# Altium footprint library hallglib.PcbLib: 106 footprints (part 4 of 7)
Each footprint in its own frame and in the unit in brackets; x right, y up, seen from the top. Pads: shape width x height; smd on the part's side, far side on the other; paste and mask are expansions set on the pad; w line width, h text height; cw(c..) or ccw(c..) is an arc to the next point about the centre after c.
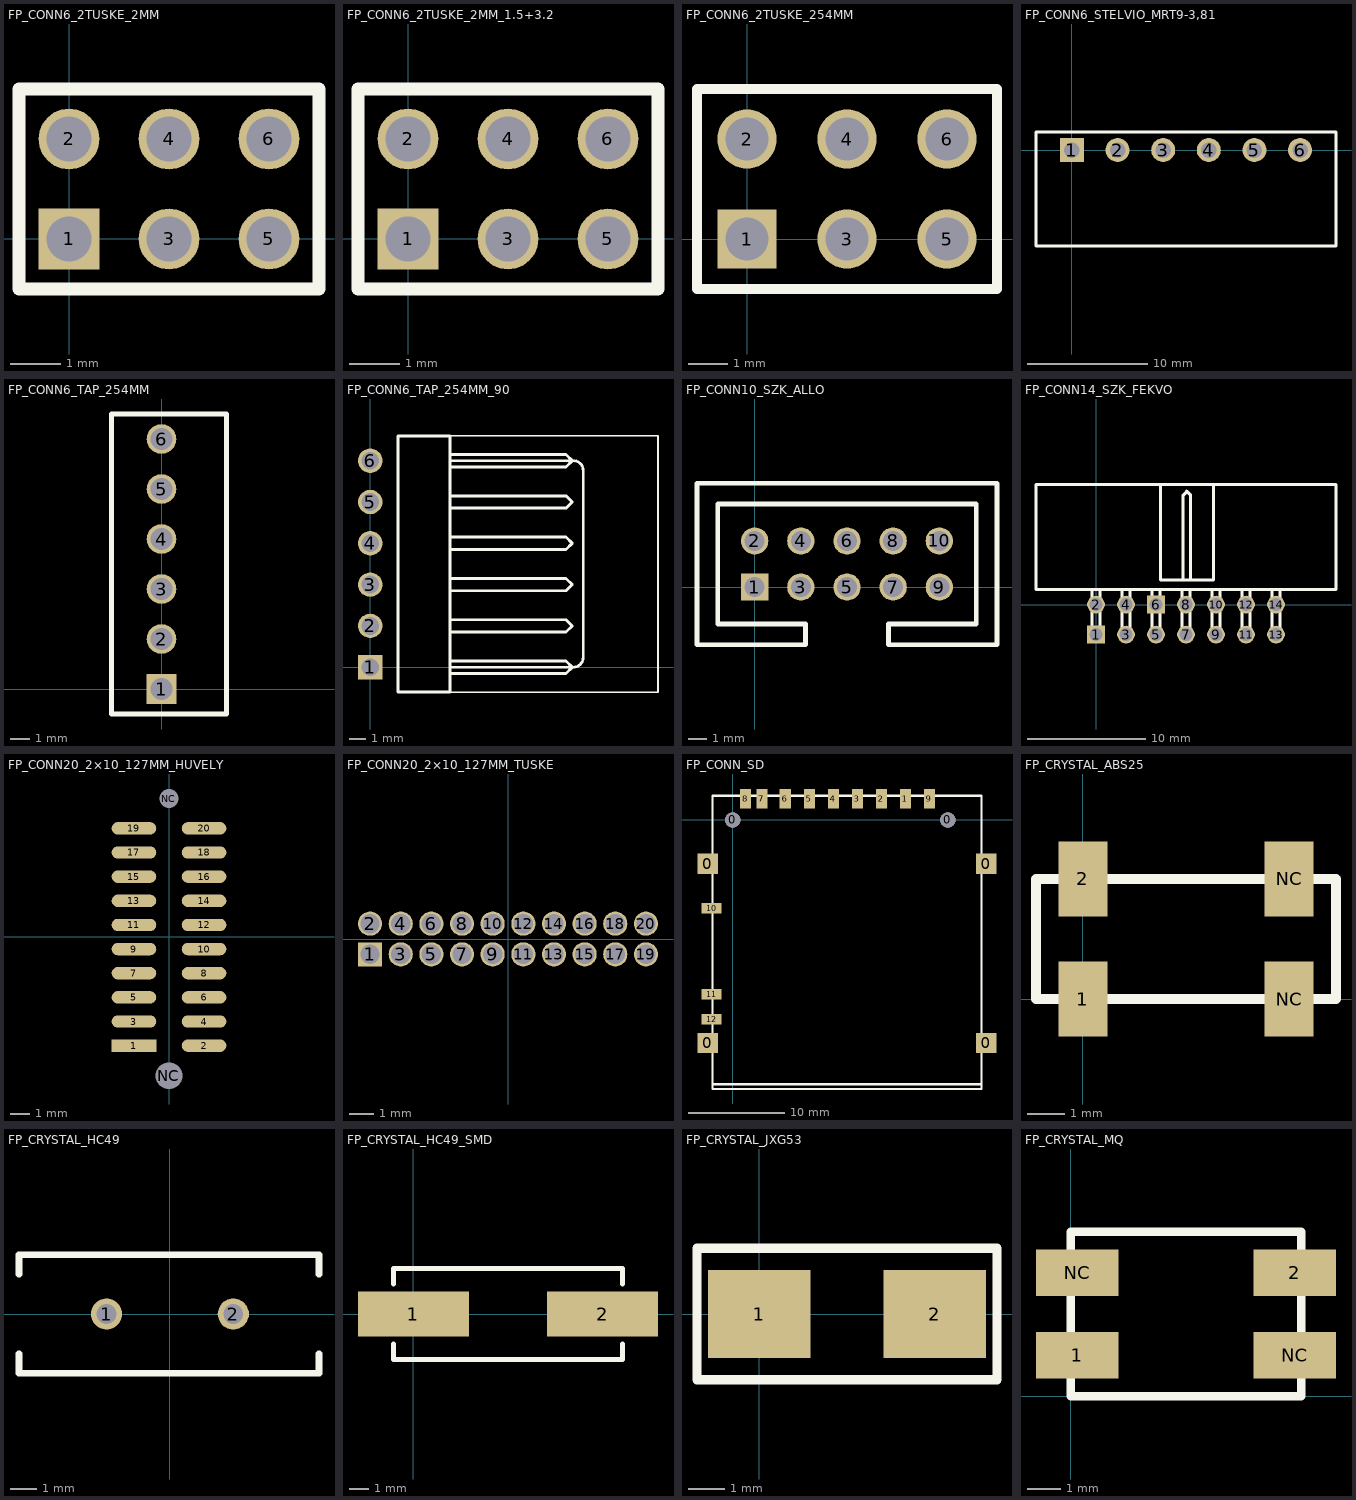
[diagram p3: the footprints below, top view; thin cyan lines are the x and y axes]

## FP_CONN6_2TUSKE_2MM [mm] "2×3-as tüskesor, 2mm-es raszter"
height 5.9
pads (6):
  rect 1.219x1.219 hole 0.9: 1(0,0)
  round 1.219 hole 0.9: 2(0,2) 3(2,0) 4(2,2) 5(4,0) 6(4,2)
Top Overlay:
  lines w0.254: -1,-1 5,-1 5,3 -1,3 -1,-1
3D body: height 5.9, standoff 2, extent -0.254,1.753 0.254,2.261
3D body: height 5.9, standoff 2, extent 1.753,-0.254 2.261,0.254
3D body: height 5.9, standoff 2, extent 1.753,1.753 2.261,2.261
3D body: height 5.9, standoff 2, extent 3.759,-0.254 4.267,0.254
3D body: height 5.9, standoff 2, extent 3.759,1.727 4.267,2.235
3D body: height 5.9, standoff 2, extent -0.254,-0.254 0.254,0.254
3D body: height 2, standoff 0, extent -1.016,-1.016 4.953,2.921
3D body: height 0, standoff -2.8, extent -0.254,-0.254 0.254,0.254
3D body: height 0, standoff -2.8, extent 3.759,1.727 4.267,2.235
3D body: height 0, standoff -2.8, extent 3.759,-0.254 4.267,0.254
3D body: height 0, standoff -2.8, extent 1.753,1.753 2.261,2.261
3D body: height 0, standoff -2.8, extent 1.753,-0.254 2.261,0.254
3D body: height 0, standoff -2.8, extent -0.254,1.753 0.254,2.261

## FP_CONN6_2TUSKE_2MM_1.5+3.2 [mm] "2×3-as tüskesor, 2mm-es raszter, 1.5mm mûanyag + 3.2mm tüske SAMTEC-TMM-1XX-01-..."
height 4.7
pads (6):
  rect 1.219x1.219 hole 0.9: 1(0,0)
  round 1.219 hole 0.9: 2(0,2) 3(2,0) 4(2,2) 5(4,0) 6(4,2)
Top Overlay:
  lines w0.254: -1,-1 -1,3 5,3 5,-1 -1,-1
3D body: height 0, standoff -3, extent -0.254,1.753 0.254,2.261
3D body: height 0, standoff -3, extent 1.753,-0.254 2.261,0.254
3D body: height 0, standoff -3, extent 1.753,1.753 2.261,2.261
3D body: height 0, standoff -3, extent 3.759,-0.254 4.267,0.254
3D body: height 0, standoff -3, extent 3.759,1.727 4.267,2.235
3D body: height 0, standoff -3, extent -0.254,-0.254 0.254,0.254
3D body: height 1.5, standoff 0, extent -1.016,-1.016 4.953,2.921
3D body: height 4.7, standoff 1.5, extent -0.254,-0.254 0.254,0.254
3D body: height 4.7, standoff 1.5, extent 3.759,1.727 4.267,2.235
3D body: height 4.7, standoff 1.5, extent 3.759,-0.254 4.267,0.254
3D body: height 4.7, standoff 1.5, extent 1.753,1.753 2.261,2.261
3D body: height 4.7, standoff 1.5, extent 1.753,-0.254 2.261,0.254
3D body: height 4.7, standoff 1.5, extent -0.254,1.753 0.254,2.261

## FP_CONN6_2TUSKE_254MM [mm] "2×3 tüskesor"
height 8.54
pads (6):
  rect 1.5x1.5 hole 1.1: 1(0,0)
  round 1.5 hole 1.1: 2(0,2.54) 3(2.54,0) 4(2.54,2.54) 5(5.08,0) 6(5.08,2.54)
Top Overlay:
  lines w0.254: -1.27,-1.27 6.35,-1.27 6.35,3.81 -1.27,3.81 -1.27,-1.27
3D body: height 8.54, standoff 2.54, extent -0.33,-0.33 0.33,0.33
3D body: height 8.54, standoff 2.54, extent 2.21,-0.33 2.87,0.33
3D body: height 8.54, standoff 2.54, extent 4.75,-0.33 5.41,0.33
3D body: height 8.54, standoff 2.54, extent 4.75,2.21 5.41,2.87
3D body: height 8.54, standoff 2.54, extent 2.21,2.21 2.87,2.87
3D body: height 8.54, standoff 2.54, extent -0.33,2.21 0.33,2.87
3D body: height 0, standoff -3, extent -0.33,2.21 0.33,2.87
3D body: height 0, standoff -3, extent 2.21,2.21 2.87,2.87
3D body: height 0, standoff -3, extent 4.75,2.21 5.41,2.87
3D body: height 0, standoff -3, extent 4.75,-0.33 5.41,0.33
3D body: height 0, standoff -3, extent 2.21,-0.33 2.87,0.33
3D body: height 0, standoff -3, extent -0.33,-0.33 0.33,0.33
3D body: height 2.54, standoff 0, extent -1.27,-1.27 6.35,3.81

## FP_CONN6_STELVIO_MRT9-3,81 [mm] "STELVIO gyártmányú sorkapocs csatlakozó MRT9 fekvõ"
height 7.25
pads (6):
  rect 2x2 hole 1.3: 1(0,0)
  round 2 hole 1.3: 2(3.81,0) 3(7.62,0) 4(11.43,0) 5(15.24,0) 6(19.05,0)
Top Overlay:
  lines w0.254: -3,-8 -3,1.5 22.05,1.5 22.05,-8 -3,-8
3D body: height 0, standoff -3, extent 18.65,-0.4 19.45,0.4
3D body: height 0, standoff -3, extent 14.84,-0.4 15.64,0.4
3D body: height 0, standoff -3, extent 11.03,-0.4 11.83,0.4
3D body: height 0, standoff -3, extent 7.22,-0.4 8.02,0.4
3D body: height 0, standoff -3, extent 3.41,-0.4 4.21,0.4
3D body: height 0, standoff -3, extent -0.4,-0.4 0.4,0.4
3D body: height 7.25, standoff 6.75, extent -1.5,-8 20.5,-1.2
3D body: height 1, standoff 0, extent -1.5,-8 20.5,-1.2
3D body: height 7.25, standoff 0, extent 16.9,-8 17.4,-1.2
3D body: height 7.25, standoff 0, extent 13.087,-8 13.587,-1.2
3D body: height 7.25, standoff 0, extent 9.275,-8 9.775,-1.2
3D body: height 7.25, standoff 0, extent 5.462,-8 5.962,-1.2
3D body: height 7.25, standoff 0, extent 1.65,-8 2.15,-1.2
3D body: height 7.25, standoff 0, extent 20.5,-8 21.5,-1.2
3D body: height 7.25, standoff 0, extent -2.5,-1.2 21.5,1.2
3D body: height 7.25, standoff 0, extent -2.5,-8 -1.5,-1.2

## FP_CONN6_TAP_254MM [mm] "álló hat pólusú tápcsatlakozó 2.54mm"
height 6.3
pads (6):
  rect 1.5x1.5 hole 1.1: 1(0,0)
  round 1.5 hole 1.1: 2(0,2.54) 3(0,5.08) 4(0,7.62) 5(0,10.16) 6(0,12.7)
Top Overlay:
  lines w0.254: -2.54,-1.27 3.302,-1.27 3.302,13.97 -2.54,13.97 -2.54,-1.27
3D body "Cvilux_CI31_6.step": height 11.56, standoff -3.24, extent -2.521,-1.27 3.279,13.97

## FP_CONN6_TAP_254MM_90 [mm] "fekvõ hat pólusú tápcsatlakozó 2.54mm"
height 6.3
pads (6):
  rect 1.5x1.5 hole 1.1: 1(0,0)
  round 1.5 hole 1.1: 2(0,2.54) 3(0,5.08) 4(0,7.62) 5(0,10.16) 6(0,12.7)
Top Overlay:
  lines w0.102: 4.9,-1.53 17.7,-1.53 17.7,14.224 4.9,14.224
  lines w0.178: 4.9,0 12.5,0 ccw(c12.5,0.6) 13.1,0.6 13.1,12.065 ; 4.9,12.7 12.5,12.7 cw(c12.5,12.1) 13.1,12.1 ; 4.934,-0.381 12.046,-0.381 12.427,0 12.046,0.381 4.934,0.381 ; 4.934,2.159 12.046,2.159 12.427,2.54 12.046,2.921 4.934,2.921 ; 4.934,4.699 12.046,4.699 12.427,5.08 12.046,5.461 4.934,5.461 ; 4.934,7.239 12.046,7.239 12.427,7.62 12.046,8.001 4.934,8.001 ; 4.934,9.779 12.046,9.779 12.427,10.16 12.046,10.541 4.934,10.541 ; 4.934,12.319 12.046,12.319 12.427,12.7 12.046,13.081 4.934,13.081 ; 1.7,-1.524 1.7,14.224 4.9,14.224 4.9,-1.524 1.7,-1.524
3D body "254_TAP_4P.STEP": height 5.8, standoff -3.4, extent -0.343,3.785 13.482,13.945
3D body "254_TAP_4P.STEP": height 5.8, standoff -3.4, extent -0.343,-1.295 13.482,8.865

## FP_CONN10_SZK_ALLO [mm]
height 9.1
pads (10):
  rect 1.5x1.5 hole 1.1: 1(0,0)
  round 1.5 hole 1.1: 2(0,2.54) 3(2.54,0) 4(2.54,2.54) 5(5.08,0) 6(5.08,2.54) 7(7.62,0) 8(7.62,2.54) 9(10.16,0) 10(10.16,2.54)
Top Overlay:
  lines w0.254: -3.175,-3.175 2.794,-3.175 2.794,-2.032 -2.032,-2.032 -2.032,4.572 12.192,4.572 12.192,-2.032 7.366,-2.032 7.366,-3.175 13.335,-3.175 13.335,5.715 -3.175,5.715 -3.175,-3.175
3D body: height 9, standoff 2.54, extent -3.175,-3.175 13.335,5.715
3D body: height 2.54, standoff 0, extent -3.175,-3.175 13.335,5.715
3D body: height 3.3, standoff 0, extent 7.29,-0.33 7.95,0.33
3D body: height 3.3, standoff 0, extent 9.83,-0.33 10.49,0.33
3D body: height 3.3, standoff 0, extent 9.83,2.21 10.49,2.87
3D body: height 3.3, standoff 0, extent 7.29,2.21 7.95,2.87
3D body: height 9, standoff 2.54, extent 7.29,2.21 7.95,2.87
3D body: height 9, standoff 2.54, extent 9.83,2.21 10.49,2.87
3D body: height 9, standoff 2.54, extent 9.83,-0.33 10.49,0.33
3D body: height 9, standoff 2.54, extent 7.29,-0.33 7.95,0.33
3D body: height 3.3, standoff 0, extent -0.33,-0.33 0.33,0.33
3D body: height 3.3, standoff 0, extent 2.21,-0.33 2.87,0.33
3D body: height 3.3, standoff 0, extent 4.75,-0.33 5.41,0.33
3D body: height 3.3, standoff 0, extent 4.75,2.21 5.41,2.87
3D body: height 3.3, standoff 0, extent 2.21,2.21 2.87,2.87
3D body: height 3.3, standoff 0, extent -0.33,2.21 0.33,2.87
3D body: height 9, standoff 2.54, extent -0.33,2.21 0.33,2.87
3D body: height 9, standoff 2.54, extent 2.21,2.21 2.87,2.87
3D body: height 9, standoff 2.54, extent 4.75,2.21 5.41,2.87
3D body: height 9, standoff 2.54, extent 4.75,-0.33 5.41,0.33
3D body: height 9, standoff 2.54, extent 2.21,-0.33 2.87,0.33
3D body: height 9, standoff 2.54, extent -0.33,-0.33 0.33,0.33

## FP_CONN14_SZK_FEKVO [mm] "14 póusú fekvõ teknõs szalagkáble csatlakozó"
height 9
pads (14):
  rect 1.5x1.5 hole 1.1: 1(0,-2.54) 6(5.08,0)
  round 1.5 hole 1.1: 2(0,0) 3(2.54,-2.54) 4(2.54,0) 5(5.08,-2.54) 7(7.62,-2.54) 8(7.62,0) 9(10.16,-2.54) 10(10.16,0) 11(12.7,-2.54) 12(12.7,0) 13(15.24,-2.54) 14(15.24,0)
Top Overlay:
  lines w0.254: -0.32,1.27 -0.32,-2.86 0.32,-2.86 0.32,1.27 ; 2.22,1.27 2.22,-2.86 2.86,-2.86 2.86,1.27 ; 4.76,1.27 4.76,-2.86 5.4,-2.86 5.4,1.27 ; 5.446,10.01 5.446,2.06 9.946,2.06 9.946,10.03 ; 7.3,1.27 7.3,-2.86 7.94,-2.86 7.94,1.27 ; 7.376,2.06 7.376,9.26 7.676,9.56 7.676,9.6 8.016,9.26 8.016,2.06 ; 9.84,1.27 9.84,-2.86 10.48,-2.86 10.48,1.27 ; 12.38,1.27 12.38,-2.86 13.02,-2.86 13.02,1.27 ; 14.92,1.27 14.92,-2.86 15.56,-2.86 15.56,1.27 ; -5.08,1.27 -5.08,10.16 20.32,10.16 20.32,1.27 -5.08,1.27
3D body: height 9, standoff 0.3, extent -5.08,1.27 20.32,3.302
3D body: height 6, standoff 5.34, extent 14.91,-2.87 15.57,10.16
3D body: height 6, standoff 5.34, extent 12.37,-2.87 13.03,10.16
3D body: height 6, standoff 5.34, extent 9.83,-2.87 10.49,10.16
3D body: height 6, standoff 5.34, extent 7.29,-2.87 7.95,10.16
3D body: height 6, standoff 5.34, extent 4.75,-2.87 5.41,10.16
3D body: height 6, standoff 5.34, extent 2.21,-2.87 2.87,10.16
3D body: height 6, standoff 5.34, extent -0.33,-2.87 0.33,10.16
3D body: height 3.46, standoff 2.8, extent 14.91,-0.33 15.57,10.16
3D body: height 3.46, standoff 2.8, extent 12.37,-0.33 13.03,10.16
3D body: height 3.46, standoff 2.8, extent 9.83,-0.33 10.49,10.16
3D body: height 3.46, standoff 2.8, extent 7.29,-0.33 7.95,10.16
3D body: height 3.46, standoff 2.8, extent 4.75,-0.33 5.41,10.16
3D body: height 3.46, standoff 2.8, extent 2.21,-0.33 2.87,10.16
3D body: height 3.46, standoff 2.8, extent -0.33,-0.33 0.33,10.16
3D body: height 3.46, standoff 0, extent -0.33,-0.33 0.33,0.33
3D body: height 3.46, standoff 0, extent 14.91,-0.33 15.57,0.33
3D body: height 3.46, standoff 0, extent 12.37,-0.33 13.03,0.33
3D body: height 3.46, standoff 0, extent 9.83,-0.33 10.49,0.33
3D body: height 3.46, standoff 0, extent 7.29,-0.33 7.95,0.33
3D body: height 3.46, standoff 0, extent 4.75,-0.33 5.41,0.33
3D body: height 3.46, standoff 0, extent 2.21,-0.33 2.87,0.33
3D body: height 6, standoff 0, extent 14.91,-2.87 15.57,-2.21
3D body: height 6, standoff 0, extent 12.37,-2.87 13.03,-2.21
3D body: height 6, standoff 0, extent 9.83,-2.87 10.49,-2.21
3D body: height 6, standoff 0, extent 7.29,-2.87 7.95,-2.21
3D body: height 6, standoff 0, extent 4.75,-2.87 5.41,-2.21
3D body: height 6, standoff 0, extent 2.21,-2.87 2.87,-2.21
3D body: height 6, standoff 0, extent -0.33,-2.87 0.33,-2.21
3D body: height 9, standoff 8, extent -5.08,1.27 20.32,10.16
3D body: height 1.3, standoff 0.3, extent -5.08,1.27 20.32,10.16
3D body: height 9, standoff 0.3, extent 19.304,3.302 20.32,10.16
3D body: height 9, standoff 0.3, extent -5.08,3.302 -4.064,10.16
3D body: height 0, standoff -3, extent -0.33,-2.87 0.33,-2.21
3D body: height 0, standoff -3, extent 2.21,-2.87 2.87,-2.21
3D body: height 0, standoff -3, extent 4.75,-2.87 5.41,-2.21
3D body: height 0, standoff -3, extent 7.29,-2.87 7.95,-2.21
3D body: height 0, standoff -3, extent 9.83,-2.87 10.49,-2.21
3D body: height 0, standoff -3, extent 12.37,-2.87 13.03,-2.21
3D body: height 0, standoff -3, extent 14.91,-2.87 15.57,-2.21
3D body: height 0, standoff -3, extent -0.33,-0.33 0.33,0.33
3D body: height 0, standoff -3, extent 2.21,-0.33 2.87,0.33
3D body: height 0, standoff -3, extent 4.75,-0.33 5.41,0.33
3D body: height 0, standoff -3, extent 7.29,-0.33 7.95,0.33
3D body: height 0, standoff -3, extent 9.83,-0.33 10.49,0.33
3D body: height 0, standoff -3, extent 12.37,-0.33 13.03,0.33
3D body: height 0, standoff -3, extent 14.91,-0.33 15.57,0.33

## FP_CONN20_2×10_127MM_HUVELY [mm] "2×10 pólusú 1,27mm raszterû hüvelysor"
height 4.85
pads (22):
  rect 2.35x0.65 smd: 1(-1.87,-5.72)
  oval 2.35x0.65 smd: 2(1.82,-5.72) 3(-1.87,-4.45) 4(1.82,-4.45) 5(-1.87,-3.18) 6(1.82,-3.18) 7(-1.87,-1.91) 8(1.82,-1.91) 9(-1.87,-0.64) 10(1.82,-0.64) 11(-1.87,0.63) 12(1.82,0.63) 13(-1.87,1.9) 14(1.82,1.9) 15(-1.87,3.17) 16(1.82,3.17) 17(-1.87,4.44) 18(1.82,4.44) 19(-1.87,5.71) 20(1.82,5.71)
  round 1.3 hole 1.4 unplated: NC(-0.025,-7.3)
  round 0.8 hole 1 unplated: NC(-0.025,7.28)
3D body: height 4.4, standoff 2.1, extent -2.075,-6.5 -1.575,-4.45
3D body: height 0.2, standoff 0, extent 0.725,5.505 2.375,5.905
3D body: height 0.2, standoff 0, extent 0.725,4.235 2.375,4.635
3D body: height 0.2, standoff 0, extent 0.725,2.965 2.375,3.365
3D body: height 0.2, standoff 0, extent 0.725,1.695 2.375,2.095
3D body: height 0.2, standoff 0, extent 0.725,0.425 2.375,0.825
3D body: height 0.2, standoff 0, extent 0.725,-0.845 2.375,-0.445
3D body: height 0.2, standoff 0, extent 0.725,-2.115 2.375,-1.715
3D body: height 0.2, standoff 0, extent 0.725,-3.385 2.375,-2.985
3D body: height 0.2, standoff 0, extent 0.725,-4.655 2.375,-4.255
3D body: height 0.2, standoff 0, extent 0.725,-5.925 2.375,-5.525
3D body: height 4.85, standoff 0.2, extent -1.575,-6.5 1.525,6.5
3D body: height 2.45, standoff 0.3, extent -0.675,-8.4 0.625,8.375
3D body: height 0.3, standoff -0.9, extent -0.422,6.881 0.375,7.679
3D body: height 0.3, standoff -0.9, extent -0.62,-7.899 0.575,-6.701
3D body: height 0.2, standoff 0, extent -2.425,-5.925 -0.775,-5.525
3D body: height 0.2, standoff 0, extent -2.425,-4.655 -0.775,-4.255
3D body: height 0.2, standoff 0, extent -2.425,-3.385 -0.775,-2.985
3D body: height 0.2, standoff 0, extent -2.425,-2.115 -0.775,-1.715
3D body: height 0.2, standoff 0, extent -2.425,-0.845 -0.775,-0.445
3D body: height 0.2, standoff 0, extent -2.425,0.425 -0.775,0.825
3D body: height 0.2, standoff 0, extent -2.425,1.695 -0.775,2.095
3D body: height 0.2, standoff 0, extent -2.425,2.965 -0.775,3.365
3D body: height 0.2, standoff 0, extent -2.425,4.235 -0.775,4.635
3D body: height 0.2, standoff 0, extent -2.425,5.505 -0.775,5.905

## FP_CONN20_2×10_127MM_TUSKE [mm] "2×10 pólusú 1,27mm raszterû tüskesor"
height 5.5
pads (20):
  rect 1x1 hole 0.8 mask+0.102: 1(-5.715,-0.635)
  round 1 hole 0.8: 2(-5.715,0.635) 3(-4.445,-0.635) 4(-4.445,0.635) 5(-3.175,-0.635) 6(-3.175,0.635) 7(-1.905,-0.635) 8(-1.905,0.635) 9(-0.635,-0.635) 10(-0.635,0.635) 11(0.635,-0.635) 12(0.635,0.635) 13(1.905,-0.635) 14(1.905,0.635) 15(3.175,-0.635) 16(3.175,0.635) 17(4.445,-0.635) 18(4.445,0.635) 19(5.715,-0.635) 20(5.715,0.635)
3D body: height 2.5, standoff 0, extent 5.08,-1.7 6.35,1.7
3D body: height 5.5, standoff -2.35, extent 5.515,-0.835 5.915,-0.435
3D body: height 5.5, standoff -2.35, extent 5.515,0.435 5.915,0.835
3D body: height 2.5, standoff 0, extent 3.81,-1.7 5.08,1.7
3D body: height 5.5, standoff -2.35, extent 4.245,-0.835 4.645,-0.435
3D body: height 5.5, standoff -2.35, extent 4.245,0.435 4.645,0.835
3D body: height 2.5, standoff 0, extent 2.54,-1.7 3.81,1.7
3D body: height 5.5, standoff -2.35, extent 2.975,-0.835 3.375,-0.435
3D body: height 5.5, standoff -2.35, extent 2.975,0.435 3.375,0.835
3D body: height 2.5, standoff 0, extent 1.27,-1.7 2.54,1.7
3D body: height 5.5, standoff -2.35, extent 1.705,-0.835 2.105,-0.435
3D body: height 5.5, standoff -2.35, extent 1.705,0.435 2.105,0.835
3D body: height 2.5, standoff 0, extent 0,-1.7 1.27,1.7
3D body: height 5.5, standoff -2.35, extent 0.435,-0.835 0.835,-0.435
3D body: height 5.5, standoff -2.35, extent 0.435,0.435 0.835,0.835
3D body: height 2.5, standoff 0, extent -1.27,-1.7 0,1.7
3D body: height 5.5, standoff -2.35, extent -0.835,-0.835 -0.435,-0.435
3D body: height 5.5, standoff -2.35, extent -0.835,0.435 -0.435,0.835
3D body: height 2.5, standoff 0, extent -2.54,-1.7 -1.27,1.7
3D body: height 5.5, standoff -2.35, extent -2.105,-0.835 -1.705,-0.435
3D body: height 5.5, standoff -2.35, extent -2.105,0.435 -1.705,0.835
3D body: height 2.5, standoff 0, extent -3.81,-1.7 -2.54,1.7
3D body: height 5.5, standoff -2.35, extent -3.375,-0.835 -2.975,-0.435
3D body: height 5.5, standoff -2.35, extent -3.375,0.435 -2.975,0.835
3D body: height 2.5, standoff 0, extent -5.08,-1.7 -3.81,1.7
3D body: height 5.5, standoff -2.35, extent -4.645,-0.835 -4.245,-0.435
3D body: height 5.5, standoff -2.35, extent -4.645,0.435 -4.245,0.835
3D body: height 5.5, standoff -2.35, extent -5.915,0.435 -5.515,0.835
3D body: height 5.5, standoff -2.35, extent -5.915,-0.835 -5.515,-0.435
3D body: height 2.5, standoff 0, extent -6.35,-1.7 -5.08,1.7

## FP_CONN_SD [mm]
height 2.9
pads (18):
  rect 2.1x2.1 smd: 0(-2.6,-23.2) 0(-2.6,-4.55) 0(26.4,-23.2) 0(26.4,-4.55)
  round 1.6 hole 1.6: 0(0,0) 0(22.4,0)
  rect 1.15x2.05 smd: 1(17.975,2.2) 2(15.475,2.2) 3(12.975,2.2) 4(10.475,2.2) 5(7.975,2.2) 6(5.475,2.2) 7(3.05,2.2) 8(1.35,2.2) 9(20.475,2.2)
  rect 2.1x1.1 smd: 10(-2.2,-9.2) 11(-2.2,-18.15) 12(-2.2,-20.75)
Top Overlay:
  lines w0.254: -2.1,-27.5 25.9,-27.5 ; -2.1,-28 -2.1,2.5 25.9,2.5 25.9,-28 -2.1,-28
3D body: height 2.1, standoff 0.7, extent -0.7,-34 23.3,-33
3D body: height 2.1, standoff 0.7, extent -0.7,-39 23.3,-34
3D body: height 2.1, standoff 0.7, extent -0.7,-33 23.3,-28
3D body: height 2.9, standoff 0, extent -2.1,-28 25.9,2.5

## FP_CRYSTAL_ABS25 [mm] "ABRACON - ABS25"
pads (4):
  rect 1.3x2 smd: 1(0,0) 2(0,3.2) NC(5.5,0) NC(5.5,3.2)
Top Overlay:
  lines w0.254: -1.25,0 -1.25,3.2 6.75,3.2 6.75,0 -1.25,0
3D body: height 2.5, standoff 0, extent -1.25,0 6.75,3.2

## FP_CRYSTAL_HC49 [mm] "HC49"
height 3.7
pads (2):
  round 1.2 hole 0.762: 1(-2.44,0) 2(2.44,0)
Top Overlay:
  lines w0.254: -5.816,-1.524 -5.816,-2.286 5.741,-2.286 5.741,-1.524 ; -5.816,1.524 -5.816,2.286 5.741,2.286 5.741,1.524
3D body "SW3dPS-HP49US.STEP": height 3.5, standoff -4, extent -5.675,-2.35 5.675,2.3

## FP_CRYSTAL_HC49_SMD [mil] "HC49/SMD"
height 118.11
pads (2):
  rect 220x90 smd: 1(0,0) 2(375,0)
Top Overlay:
  lines w10: -40,-60 -40,-90 415,-90 415,-60 ; -40,60 -40,90 415,90 415,60
3D body: height 5, standoff 0, extent 415,-20 432,20
3D body: height 5, standoff 0, extent -57,-20 -40,20
3D body: height 10, standoff 0, extent -40,-90 415,90
3D body: height 130, standoff 10, extent -25,-80 400,80

## FP_CRYSTAL_JXG53 [mm] "JXG53 kristály tokozás"
height 1
pads (2):
  rect 2.8x2.4 smd: 1(0,0) 2(4.8,0)
Top Overlay:
  lines w0.254: -1.7,-1.8 6.5,-1.8 6.5,1.8 -1.7,1.8 -1.7,-1.8
3D body: height 1, standoff 0, extent -0.127,-1.524 4.953,1.524

## FP_CRYSTAL_MQ [mm] "EuroQuartz MQ tok"
height 1.2
pads (4):
  rect 2.5x1.4 smd: 1(0.2,1.25) 2(6.8,3.75) NC(0.2,3.75) NC(6.8,1.25)
Top Overlay:
  lines w0.254: 0,0 0,5 7,5 7,0 0,0
3D body "User Library-GeyerElectronics_KX13.STEP": height 1.31, standoff 0, extent 0,0 7,5